# Altium schematic symbol library jlcpcb_2025_04_resistors_extended_1210.schlib: 2670 symbols (part 11 of 14) (continued)
## RC1210JR-07300RL (continued)
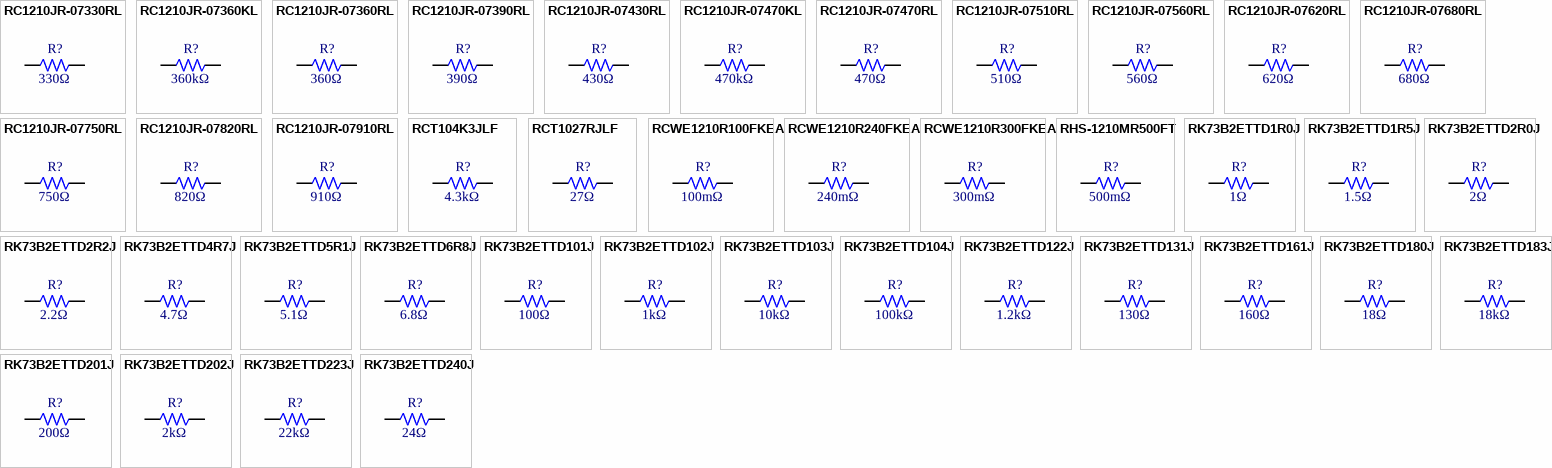
[diagram p51: symbols RC1210JR-07330RL to RK73B2ETTD240J]

## RC1210JR-07330RL
designator R?  Resistance: 330Ω  (hidden comment: *)
Resistor, 330Ω, ±5%, 500mW, 200V, ±100ppm/℃, -55℃~+155℃, SMD 1210; Manufacturer: Uniroyal; Manufacturer Part Number: RC1210JR-07330RL; Supplier 1: LCSC; Supplier Part Number 1: C724013; JLCPCB Part Number: C724013; Power Rating: 500mW; Category: Resistors; Package Size: 1210; JLCPCB Basic Part: Yes; Tolerance: ±5%; Voltage Rating: 200V; Temperature Coefficient: ±100ppm/℃; Temperature Rating: -55℃~+155℃; ComponentLink1Description: Datasheet; ComponentLink1URL: https://wmsc.lcsc.com/wmsc/upload/file/pdf/v2/lcsc/2204291430_YAGEO-RC1210JR-07330RL_C724013.pdf; ComponentLink2Description: JLCPCB Part URL; ComponentLink2URL: https://jlcpcb.com/partdetail/C724013
pins: 1, 2
1 alternate drawing of the same symbol

## RC1210JR-07360KL
designator R?  Resistance: 360kΩ  (hidden comment: *)
Resistor, 360kΩ, ±5%, 500mW, ±100ppm/℃, -55℃~+155℃, SMD 1210; Manufacturer: Uniroyal; Manufacturer Part Number: RC1210JR-07360KL; Supplier 1: LCSC; Supplier Part Number 1: C728402; JLCPCB Part Number: C728402; Power Rating: 500mW; Category: Resistors; Package Size: 1210; JLCPCB Basic Part: Yes; Tolerance: ±5%; Temperature Coefficient: ±100ppm/℃; Temperature Rating: -55℃~+155℃; ComponentLink1Description: Datasheet; ComponentLink1URL: https://wmsc.lcsc.com/wmsc/upload/file/pdf/v2/lcsc/2304140030_YAGEO-RC1210JR-07360KL_C728402.pdf; ComponentLink2Description: JLCPCB Part URL; ComponentLink2URL: https://jlcpcb.com/partdetail/C728402
pins: 1, 2
1 alternate drawing of the same symbol

## RC1210JR-07360RL
designator R?  Resistance: 360Ω  (hidden comment: *)
Resistor, 360Ω, ±5%, 500mW, 200V, ±100ppm/℃, -55℃~+155℃, SMD 1210; Manufacturer: Uniroyal; Manufacturer Part Number: RC1210JR-07360RL; Supplier 1: LCSC; Supplier Part Number 1: C728403; JLCPCB Part Number: C728403; Power Rating: 500mW; Category: Resistors; Package Size: 1210; JLCPCB Basic Part: Yes; Tolerance: ±5%; Voltage Rating: 200V; Temperature Coefficient: ±100ppm/℃; Temperature Rating: -55℃~+155℃; ComponentLink1Description: Datasheet; ComponentLink1URL: https://wmsc.lcsc.com/wmsc/upload/file/pdf/v2/lcsc/2304140030_YAGEO-RC1210JR-07360RL_C728403.pdf; ComponentLink2Description: JLCPCB Part URL; ComponentLink2URL: https://jlcpcb.com/partdetail/C728403
pins: 1, 2
1 alternate drawing of the same symbol

## RC1210JR-07390RL
designator R?  Resistance: 390Ω  (hidden comment: *)
Resistor, 390Ω, ±5%, 500mW, 200V, ±100ppm/℃, -55℃~+155℃, SMD 1210; Manufacturer: Uniroyal; Manufacturer Part Number: RC1210JR-07390RL; Supplier 1: LCSC; Supplier Part Number 1: C326895; JLCPCB Part Number: C326895; Power Rating: 500mW; Category: Resistors; Package Size: 1210; JLCPCB Basic Part: Yes; Tolerance: ±5%; Voltage Rating: 200V; Temperature Coefficient: ±100ppm/℃; Temperature Rating: -55℃~+155℃; ComponentLink1Description: Datasheet; ComponentLink1URL: https://wmsc.lcsc.com/wmsc/upload/file/pdf/v2/lcsc/1811141450_YAGEO-RC1210JR-07390RL_C326895.pdf; ComponentLink2Description: JLCPCB Part URL; ComponentLink2URL: https://jlcpcb.com/partdetail/C326895
pins: 1, 2
1 alternate drawing of the same symbol

## RC1210JR-07430RL
designator R?  Resistance: 430Ω  (hidden comment: *)
Resistor, 430Ω, ±5%, 500mW, ±100ppm/℃, -55℃~+155℃, SMD 1210; Manufacturer: Uniroyal; Manufacturer Part Number: RC1210JR-07430RL; Supplier 1: LCSC; Supplier Part Number 1: C728408; JLCPCB Part Number: C728408; Power Rating: 500mW; Category: Resistors; Package Size: 1210; JLCPCB Basic Part: Yes; Tolerance: ±5%; Temperature Coefficient: ±100ppm/℃; Temperature Rating: -55℃~+155℃; ComponentLink1Description: Datasheet; ComponentLink1URL: https://wmsc.lcsc.com/wmsc/upload/file/pdf/v2/lcsc/2304140030_YAGEO-RC1210JR-07430RL_C728408.pdf; ComponentLink2Description: JLCPCB Part URL; ComponentLink2URL: https://jlcpcb.com/partdetail/C728408
pins: 1, 2
1 alternate drawing of the same symbol

## RC1210JR-07470KL
designator R?  Resistance: 470kΩ  (hidden comment: *)
Resistor, 470kΩ, ±5%, 500mW, 200V, ±100ppm/℃, -55℃~+155℃, SMD 1210; Manufacturer: Uniroyal; Manufacturer Part Number: RC1210JR-07470KL; Supplier 1: LCSC; Supplier Part Number 1: C276324; JLCPCB Part Number: C276324; Power Rating: 500mW; Category: Resistors; Package Size: 1210; JLCPCB Basic Part: Yes; Tolerance: ±5%; Voltage Rating: 200V; Temperature Coefficient: ±100ppm/℃; Temperature Rating: -55℃~+155℃; ComponentLink1Description: Datasheet; ComponentLink1URL: https://wmsc.lcsc.com/wmsc/upload/file/pdf/v2/lcsc/2304140030_YAGEO-RC1210JR-07470KL_C276324.pdf; ComponentLink2Description: JLCPCB Part URL; ComponentLink2URL: https://jlcpcb.com/partdetail/C276324
pins: 1, 2
1 alternate drawing of the same symbol

## RC1210JR-07470RL
designator R?  Resistance: 470Ω  (hidden comment: *)
Resistor, 470Ω, ±5%, 500mW, 200V, ±100ppm/℃, -55℃~+155℃, SMD 1210; Manufacturer: Uniroyal; Manufacturer Part Number: RC1210JR-07470RL; Supplier 1: LCSC; Supplier Part Number 1: C137072; JLCPCB Part Number: C137072; Power Rating: 500mW; Category: Resistors; Package Size: 1210; JLCPCB Basic Part: Yes; Tolerance: ±5%; Voltage Rating: 200V; Temperature Coefficient: ±100ppm/℃; Temperature Rating: -55℃~+155℃; ComponentLink1Description: Datasheet; ComponentLink1URL: https://wmsc.lcsc.com/wmsc/upload/file/pdf/v2/lcsc/2304140030_YAGEO-RC1210JR-07470RL_C137072.pdf; ComponentLink2Description: JLCPCB Part URL; ComponentLink2URL: https://jlcpcb.com/partdetail/C137072
pins: 1, 2
1 alternate drawing of the same symbol

## RC1210JR-07510RL
designator R?  Resistance: 510Ω  (hidden comment: *)
Resistor, 510Ω, ±5%, 500mW, 200V, ±100ppm/℃, -55℃~+155℃, SMD 1210; Manufacturer: Uniroyal; Manufacturer Part Number: RC1210JR-07510RL; Supplier 1: LCSC; Supplier Part Number 1: C276328; JLCPCB Part Number: C276328; Power Rating: 500mW; Category: Resistors; Package Size: 1210; JLCPCB Basic Part: Yes; Tolerance: ±5%; Voltage Rating: 200V; Temperature Coefficient: ±100ppm/℃; Temperature Rating: -55℃~+155℃; ComponentLink1Description: Datasheet; ComponentLink1URL: https://wmsc.lcsc.com/wmsc/upload/file/pdf/v2/lcsc/2304140030_YAGEO-RC1210JR-07510RL_C276328.pdf; ComponentLink2Description: JLCPCB Part URL; ComponentLink2URL: https://jlcpcb.com/partdetail/C276328
pins: 1, 2
1 alternate drawing of the same symbol

## RC1210JR-07560RL
designator R?  Resistance: 560Ω  (hidden comment: *)
Resistor, 560Ω, ±5%, 500mW, ±100ppm/℃, -55℃~+155℃, SMD 1210; Manufacturer: Uniroyal; Manufacturer Part Number: RC1210JR-07560RL; Supplier 1: LCSC; Supplier Part Number 1: C728410; JLCPCB Part Number: C728410; Power Rating: 500mW; Category: Resistors; Package Size: 1210; JLCPCB Basic Part: Yes; Tolerance: ±5%; Temperature Coefficient: ±100ppm/℃; Temperature Rating: -55℃~+155℃; ComponentLink1Description: Datasheet; ComponentLink1URL: https://wmsc.lcsc.com/wmsc/upload/file/pdf/v2/lcsc/2304140030_YAGEO-RC1210JR-07560RL_C728410.pdf; ComponentLink2Description: JLCPCB Part URL; ComponentLink2URL: https://jlcpcb.com/partdetail/C728410
pins: 1, 2
1 alternate drawing of the same symbol

## RC1210JR-07620RL
designator R?  Resistance: 620Ω  (hidden comment: *)
Resistor, 620Ω, ±5%, 500mW, 200V, ±100ppm/℃, -55℃~+155℃, SMD 1210; Manufacturer: Uniroyal; Manufacturer Part Number: RC1210JR-07620RL; Supplier 1: LCSC; Supplier Part Number 1: C723675; JLCPCB Part Number: C723675; Power Rating: 500mW; Category: Resistors; Package Size: 1210; JLCPCB Basic Part: Yes; Tolerance: ±5%; Voltage Rating: 200V; Temperature Coefficient: ±100ppm/℃; Temperature Rating: -55℃~+155℃; ComponentLink1Description: Datasheet; ComponentLink1URL: https://wmsc.lcsc.com/wmsc/upload/file/pdf/v2/lcsc/2008171336_YAGEO-RC1210JR-07620RL_C723675.pdf; ComponentLink2Description: JLCPCB Part URL; ComponentLink2URL: https://jlcpcb.com/partdetail/C723675
pins: 1, 2
1 alternate drawing of the same symbol

## RC1210JR-07680RL
designator R?  Resistance: 680Ω  (hidden comment: *)
Resistor, 680Ω, ±5%, 500mW, 200V, ±100ppm/℃, -55℃~+155℃, SMD 1210; Manufacturer: Uniroyal; Manufacturer Part Number: RC1210JR-07680RL; Supplier 1: LCSC; Supplier Part Number 1: C137071; JLCPCB Part Number: C137071; Power Rating: 500mW; Category: Resistors; Package Size: 1210; JLCPCB Basic Part: Yes; Tolerance: ±5%; Voltage Rating: 200V; Temperature Coefficient: ±100ppm/℃; Temperature Rating: -55℃~+155℃; ComponentLink1Description: Datasheet; ComponentLink1URL: https://wmsc.lcsc.com/wmsc/upload/file/pdf/v2/lcsc/2304140030_YAGEO-RC1210JR-07680RL_C137071.pdf; ComponentLink2Description: JLCPCB Part URL; ComponentLink2URL: https://jlcpcb.com/partdetail/C137071
pins: 1, 2
1 alternate drawing of the same symbol

## RC1210JR-07750RL
designator R?  Resistance: 750Ω  (hidden comment: *)
Resistor, 750Ω, ±5%, 500mW, 200V, ±100ppm/℃, -55℃~+155℃, SMD 1210; Manufacturer: Uniroyal; Manufacturer Part Number: RC1210JR-07750RL; Supplier 1: LCSC; Supplier Part Number 1: C137070; JLCPCB Part Number: C137070; Power Rating: 500mW; Category: Resistors; Package Size: 1210; JLCPCB Basic Part: Yes; Tolerance: ±5%; Voltage Rating: 200V; Temperature Coefficient: ±100ppm/℃; Temperature Rating: -55℃~+155℃; ComponentLink1Description: Datasheet; ComponentLink1URL: https://wmsc.lcsc.com/wmsc/upload/file/pdf/v2/lcsc/2304140030_YAGEO-RC1210JR-07750RL_C137070.pdf; ComponentLink2Description: JLCPCB Part URL; ComponentLink2URL: https://jlcpcb.com/partdetail/C137070
pins: 1, 2
1 alternate drawing of the same symbol

## RC1210JR-07820RL
designator R?  Resistance: 820Ω  (hidden comment: *)
Resistor, 820Ω, ±5%, 500mW, 200V, ±100ppm/℃, -55℃~+155℃, SMD 1210; Manufacturer: Uniroyal; Manufacturer Part Number: RC1210JR-07820RL; Supplier 1: LCSC; Supplier Part Number 1: C137068; JLCPCB Part Number: C137068; Power Rating: 500mW; Category: Resistors; Package Size: 1210; JLCPCB Basic Part: Yes; Tolerance: ±5%; Voltage Rating: 200V; Temperature Coefficient: ±100ppm/℃; Temperature Rating: -55℃~+155℃; ComponentLink1Description: Datasheet; ComponentLink1URL: https://wmsc.lcsc.com/wmsc/upload/file/pdf/v2/lcsc/2304140030_YAGEO-RC1210JR-07820RL_C137068.pdf; ComponentLink2Description: JLCPCB Part URL; ComponentLink2URL: https://jlcpcb.com/partdetail/C137068
pins: 1, 2
1 alternate drawing of the same symbol

## RC1210JR-07910RL
designator R?  Resistance: 910Ω  (hidden comment: *)
Resistor, 910Ω, ±5%, 500mW, ±100ppm/℃, -55℃~+155℃, SMD 1210; Manufacturer: Uniroyal; Manufacturer Part Number: RC1210JR-07910RL; Supplier 1: LCSC; Supplier Part Number 1: C723577; JLCPCB Part Number: C723577; Power Rating: 500mW; Category: Resistors; Package Size: 1210; JLCPCB Basic Part: Yes; Tolerance: ±5%; Temperature Coefficient: ±100ppm/℃; Temperature Rating: -55℃~+155℃; ComponentLink1Description: Datasheet; ComponentLink1URL: https://wmsc.lcsc.com/wmsc/upload/file/pdf/v2/lcsc/2008171334_YAGEO-RC1210JR-07910RL_C723577.pdf; ComponentLink2Description: JLCPCB Part URL; ComponentLink2URL: https://jlcpcb.com/partdetail/C723577
pins: 1, 2
1 alternate drawing of the same symbol

## RCT104K3JLF
designator R?  Resistance: 4.3kΩ  (hidden comment: *)
Resistor, 4.3kΩ, ±5%, 333.333mW, SMD 1210; Manufacturer: Uniroyal; Manufacturer Part Number: RCT104K3JLF; Supplier 1: LCSC; Supplier Part Number 1: C185761; JLCPCB Part Number: C185761; Power Rating: 333.333mW; Category: Resistors; Package Size: 1210; JLCPCB Basic Part: Yes; Tolerance: ±5%; ComponentLink1Description: Datasheet; ComponentLink1URL: https://datasheet.lcsc.com/lcsc/2304140030_HKR-Hong-Kong-Resistors-RCT104K3JLF_C185761.pdf; ComponentLink2Description: JLCPCB Part URL; ComponentLink2URL: https://jlcpcb.com/partdetail/C185761
pins: 1, 2
1 alternate drawing of the same symbol

## RCT1027RJLF
designator R?  Resistance: 27Ω  (hidden comment: *)
Resistor, 27Ω, ±5%, 333.333mW, SMD 1210; Manufacturer: Uniroyal; Manufacturer Part Number: RCT1027RJLF; Supplier 1: LCSC; Supplier Part Number 1: C185752; JLCPCB Part Number: C185752; Power Rating: 333.333mW; Category: Resistors; Package Size: 1210; JLCPCB Basic Part: Yes; Tolerance: ±5%; ComponentLink1Description: Datasheet; ComponentLink1URL: https://datasheet.lcsc.com/lcsc/2304140030_HKR-Hong-Kong-Resistors-RCT1027RJLF_C185752.pdf; ComponentLink2Description: JLCPCB Part URL; ComponentLink2URL: https://jlcpcb.com/partdetail/C185752
pins: 1, 2
1 alternate drawing of the same symbol

## RCWE1210R100FKEA
designator R?  Resistance: 100mΩ  (hidden comment: *)
Resistor, 100mΩ, ±1%, 1W, 300V, ±100ppm/℃, -55℃~+155℃, SMD 1210; Manufacturer: Uniroyal; Manufacturer Part Number: RCWE1210R100FKEA; Supplier 1: LCSC; Supplier Part Number 1: C2094571; JLCPCB Part Number: C2094571; Power Rating: 1W; Category: Resistors; Package Size: 1210; JLCPCB Basic Part: Yes; Tolerance: ±1%; Voltage Rating: 300V; Temperature Coefficient: ±100ppm/℃; Temperature Rating: -55℃~+155℃; ComponentLink1Description: Datasheet; ComponentLink1URL: https://wmsc.lcsc.com/wmsc/upload/file/pdf/v2/lcsc/2304140030_Vishay-Intertech-RCWE1210R100FKEA_C2094571.pdf; ComponentLink2Description: JLCPCB Part URL; ComponentLink2URL: https://jlcpcb.com/partdetail/C2094571
pins: 1, 2
1 alternate drawing of the same symbol

## RCWE1210R240FKEA
designator R?  Resistance: 240mΩ  (hidden comment: *)
Resistor, 240mΩ, ±1%, 1W, 300V, ±100ppm/℃, -55℃~+155℃, SMD 1210; Manufacturer: Uniroyal; Manufacturer Part Number: RCWE1210R240FKEA; Supplier 1: LCSC; Supplier Part Number 1: C2088954; JLCPCB Part Number: C2088954; Power Rating: 1W; Category: Resistors; Package Size: 1210; JLCPCB Basic Part: Yes; Tolerance: ±1%; Voltage Rating: 300V; Temperature Coefficient: ±100ppm/℃; Temperature Rating: -55℃~+155℃; ComponentLink1Description: Datasheet; ComponentLink1URL: https://wmsc.lcsc.com/wmsc/upload/file/pdf/v2/lcsc/2304140030_Vishay-Intertech-RCWE1210R240FKEA_C2088954.pdf; ComponentLink2Description: JLCPCB Part URL; ComponentLink2URL: https://jlcpcb.com/partdetail/C2088954
pins: 1, 2
1 alternate drawing of the same symbol

## RCWE1210R300FKEA
designator R?  Resistance: 300mΩ  (hidden comment: *)
Resistor, 300mΩ, ±1%, 1W, ±100ppm/℃, -55℃~+155℃, SMD 1210; Manufacturer: Uniroyal; Manufacturer Part Number: RCWE1210R300FKEA; Supplier 1: LCSC; Supplier Part Number 1: C4014599; JLCPCB Part Number: C4014599; Power Rating: 1W; Category: Resistors; Package Size: 1210; JLCPCB Basic Part: Yes; Tolerance: ±1%; Temperature Coefficient: ±100ppm/℃; Temperature Rating: -55℃~+155℃; ComponentLink1Description: Datasheet; ComponentLink1URL: https://wmsc.lcsc.com/wmsc/upload/file/pdf/v2/lcsc/2312130920_Vishay-Intertech-RCWE1210R300FKEA_C4014599.pdf; ComponentLink2Description: JLCPCB Part URL; ComponentLink2URL: https://jlcpcb.com/partdetail/C4014599
pins: 1, 2
1 alternate drawing of the same symbol

## RHS-1210MR500FT
designator R?  Resistance: 500mΩ  (hidden comment: *)
Resistor, 500mΩ, ±1%, SMD 1210; Manufacturer: Uniroyal; Manufacturer Part Number: RHS-1210MR500FT; Supplier 1: LCSC; Supplier Part Number 1: C2991678; JLCPCB Part Number: C2991678; Category: Resistors; Package Size: 1210; JLCPCB Basic Part: Yes; Tolerance: ±1%; ComponentLink1Description: Datasheet; ComponentLink1URL: https://wmsc.lcsc.com/wmsc/upload/file/pdf/v2/lcsc/2211281000_FH--Guangdong-Fenghua-Advanced-Tech-RHS-1210MR500FT_C2991678.pdf; ComponentLink2Description: JLCPCB Part URL; ComponentLink2URL: https://jlcpcb.com/partdetail/C2991678
pins: 1, 2
1 alternate drawing of the same symbol

## RK73B2ETTD1R0J
designator R?  Resistance: 1Ω  (hidden comment: *)
Resistor, 1Ω, ±5%, 500mW, ±200ppm/℃, -55℃~+155℃, SMD 1210; Manufacturer: Uniroyal; Manufacturer Part Number: RK73B2ETTD1R0J; Supplier 1: LCSC; Supplier Part Number 1: C830163; JLCPCB Part Number: C830163; Power Rating: 500mW; Category: Resistors; Package Size: 1210; JLCPCB Basic Part: Yes; Tolerance: ±5%; Temperature Coefficient: ±200ppm/℃; Temperature Rating: -55℃~+155℃; ComponentLink1Description: Datasheet; ComponentLink1URL: https://wmsc.lcsc.com/wmsc/upload/file/pdf/v2/lcsc/2403141437_KOA-Speer-Elec-RK73B2ETTD1R0J_C830163.pdf; ComponentLink2Description: JLCPCB Part URL; ComponentLink2URL: https://jlcpcb.com/partdetail/C830163
pins: 1, 2
1 alternate drawing of the same symbol

## RK73B2ETTD1R5J
designator R?  Resistance: 1.5Ω  (hidden comment: *)
Resistor, 1.5Ω, ±5%, 500mW, ±200ppm/℃, -55℃~+155℃, SMD 1210; Manufacturer: Uniroyal; Manufacturer Part Number: RK73B2ETTD1R5J; Supplier 1: LCSC; Supplier Part Number 1: C830164; JLCPCB Part Number: C830164; Power Rating: 500mW; Category: Resistors; Package Size: 1210; JLCPCB Basic Part: Yes; Tolerance: ±5%; Temperature Coefficient: ±200ppm/℃; Temperature Rating: -55℃~+155℃; ComponentLink1Description: Datasheet; ComponentLink1URL: https://wmsc.lcsc.com/wmsc/upload/file/pdf/v2/lcsc/2403141437_KOA-Speer-Elec-RK73B2ETTD1R5J_C830164.pdf; ComponentLink2Description: JLCPCB Part URL; ComponentLink2URL: https://jlcpcb.com/partdetail/C830164
pins: 1, 2
1 alternate drawing of the same symbol

## RK73B2ETTD2R0J
designator R?  Resistance: 2Ω  (hidden comment: *)
Resistor, 2Ω, ±5%, 500mW, ±200ppm/℃, -55℃~+155℃, SMD 1210; Manufacturer: Uniroyal; Manufacturer Part Number: RK73B2ETTD2R0J; Supplier 1: LCSC; Supplier Part Number 1: C830178; JLCPCB Part Number: C830178; Power Rating: 500mW; Category: Resistors; Package Size: 1210; JLCPCB Basic Part: Yes; Tolerance: ±5%; Temperature Coefficient: ±200ppm/℃; Temperature Rating: -55℃~+155℃; ComponentLink1Description: Datasheet; ComponentLink1URL: https://wmsc.lcsc.com/wmsc/upload/file/pdf/v2/lcsc/2403141437_KOA-Speer-Elec-RK73B2ETTD2R0J_C830178.pdf; ComponentLink2Description: JLCPCB Part URL; ComponentLink2URL: https://jlcpcb.com/partdetail/C830178
pins: 1, 2
1 alternate drawing of the same symbol

## RK73B2ETTD2R2J
designator R?  Resistance: 2.2Ω  (hidden comment: *)
Resistor, 2.2Ω, ±5%, 500mW, ±200ppm/℃, -55℃~+155℃, SMD 1210; Manufacturer: Uniroyal; Manufacturer Part Number: RK73B2ETTD2R2J; Supplier 1: LCSC; Supplier Part Number 1: C830179; JLCPCB Part Number: C830179; Power Rating: 500mW; Category: Resistors; Package Size: 1210; JLCPCB Basic Part: Yes; Tolerance: ±5%; Temperature Coefficient: ±200ppm/℃; Temperature Rating: -55℃~+155℃; ComponentLink1Description: Datasheet; ComponentLink1URL: https://wmsc.lcsc.com/wmsc/upload/file/pdf/v2/lcsc/2403141437_KOA-Speer-Elec-RK73B2ETTD2R2J_C830179.pdf; ComponentLink2Description: JLCPCB Part URL; ComponentLink2URL: https://jlcpcb.com/partdetail/C830179
pins: 1, 2
1 alternate drawing of the same symbol

## RK73B2ETTD4R7J
designator R?  Resistance: 4.7Ω  (hidden comment: *)
Resistor, 4.7Ω, ±5%, 500mW, ±200ppm/℃, -55℃~+155℃, SMD 1210; Manufacturer: Uniroyal; Manufacturer Part Number: RK73B2ETTD4R7J; Supplier 1: LCSC; Supplier Part Number 1: C830189; JLCPCB Part Number: C830189; Power Rating: 500mW; Category: Resistors; Package Size: 1210; JLCPCB Basic Part: Yes; Tolerance: ±5%; Temperature Coefficient: ±200ppm/℃; Temperature Rating: -55℃~+155℃; ComponentLink1Description: Datasheet; ComponentLink1URL: https://wmsc.lcsc.com/wmsc/upload/file/pdf/v2/lcsc/2403141437_KOA-Speer-Elec-RK73B2ETTD4R7J_C830189.pdf; ComponentLink2Description: JLCPCB Part URL; ComponentLink2URL: https://jlcpcb.com/partdetail/C830189
pins: 1, 2
1 alternate drawing of the same symbol

## RK73B2ETTD5R1J
designator R?  Resistance: 5.1Ω  (hidden comment: *)
Resistor, 5.1Ω, ±5%, 500mW, ±200ppm/℃, -55℃~+155℃, SMD 1210; Manufacturer: Uniroyal; Manufacturer Part Number: RK73B2ETTD5R1J; Supplier 1: LCSC; Supplier Part Number 1: C830192; JLCPCB Part Number: C830192; Power Rating: 500mW; Category: Resistors; Package Size: 1210; JLCPCB Basic Part: Yes; Tolerance: ±5%; Temperature Coefficient: ±200ppm/℃; Temperature Rating: -55℃~+155℃; ComponentLink1Description: Datasheet; ComponentLink1URL: https://wmsc.lcsc.com/wmsc/upload/file/pdf/v2/lcsc/2403141437_KOA-Speer-Elec-RK73B2ETTD5R1J_C830192.pdf; ComponentLink2Description: JLCPCB Part URL; ComponentLink2URL: https://jlcpcb.com/partdetail/C830192
pins: 1, 2
1 alternate drawing of the same symbol

## RK73B2ETTD6R8J
designator R?  Resistance: 6.8Ω  (hidden comment: *)
Resistor, 6.8Ω, ±5%, 500mW, ±200ppm/℃, -55℃~+155℃, SMD 1210; Manufacturer: Uniroyal; Manufacturer Part Number: RK73B2ETTD6R8J; Supplier 1: LCSC; Supplier Part Number 1: C830198; JLCPCB Part Number: C830198; Power Rating: 500mW; Category: Resistors; Package Size: 1210; JLCPCB Basic Part: Yes; Tolerance: ±5%; Temperature Coefficient: ±200ppm/℃; Temperature Rating: -55℃~+155℃; ComponentLink1Description: Datasheet; ComponentLink1URL: https://wmsc.lcsc.com/wmsc/upload/file/pdf/v2/lcsc/2403141437_KOA-Speer-Elec-RK73B2ETTD6R8J_C830198.pdf; ComponentLink2Description: JLCPCB Part URL; ComponentLink2URL: https://jlcpcb.com/partdetail/C830198
pins: 1, 2
1 alternate drawing of the same symbol

## RK73B2ETTD101J
designator R?  Resistance: 100Ω  (hidden comment: *)
Resistor, 100Ω, ±5%, 750mW, 200V, ±200ppm/℃, -55℃~+155℃, SMD 1210; Manufacturer: Uniroyal; Manufacturer Part Number: RK73B2ETTD101J; Supplier 1: LCSC; Supplier Part Number 1: C131363; JLCPCB Part Number: C131363; Power Rating: 750mW; Category: Resistors; Package Size: 1210; JLCPCB Basic Part: Yes; Tolerance: ±5%; Voltage Rating: 200V; Temperature Coefficient: ±200ppm/℃; Temperature Rating: -55℃~+155℃; ComponentLink1Description: Datasheet; ComponentLink1URL: https://wmsc.lcsc.com/wmsc/upload/file/pdf/v2/lcsc/2403141437_KOA-Speer-Elec-RK73B2ETTD101J_C131363.pdf; ComponentLink2Description: JLCPCB Part URL; ComponentLink2URL: https://jlcpcb.com/partdetail/C131363
pins: 1, 2
1 alternate drawing of the same symbol

## RK73B2ETTD102J
designator R?  Resistance: 1kΩ  (hidden comment: *)
Resistor, 1kΩ, ±5%, 750mW, 200V, ±200ppm/℃, -55℃~+155℃, SMD 1210; Manufacturer: Uniroyal; Manufacturer Part Number: RK73B2ETTD102J; Supplier 1: LCSC; Supplier Part Number 1: C131364; JLCPCB Part Number: C131364; Power Rating: 750mW; Category: Resistors; Package Size: 1210; JLCPCB Basic Part: Yes; Tolerance: ±5%; Voltage Rating: 200V; Temperature Coefficient: ±200ppm/℃; Temperature Rating: -55℃~+155℃; ComponentLink1Description: Datasheet; ComponentLink1URL: https://wmsc.lcsc.com/wmsc/upload/file/pdf/v2/lcsc/2403141437_KOA-Speer-Elec-RK73B2ETTD102J_C131364.pdf; ComponentLink2Description: JLCPCB Part URL; ComponentLink2URL: https://jlcpcb.com/partdetail/C131364
pins: 1, 2
1 alternate drawing of the same symbol

## RK73B2ETTD103J
designator R?  Resistance: 10kΩ  (hidden comment: *)
Resistor, 10kΩ, ±5%, 750mW, 200V, ±200ppm/℃, -55℃~+155℃, SMD 1210; Manufacturer: Uniroyal; Manufacturer Part Number: RK73B2ETTD103J; Supplier 1: LCSC; Supplier Part Number 1: C131365; JLCPCB Part Number: C131365; Power Rating: 750mW; Category: Resistors; Package Size: 1210; JLCPCB Basic Part: Yes; Tolerance: ±5%; Voltage Rating: 200V; Temperature Coefficient: ±200ppm/℃; Temperature Rating: -55℃~+155℃; ComponentLink1Description: Datasheet; ComponentLink1URL: https://wmsc.lcsc.com/wmsc/upload/file/pdf/v2/lcsc/2403141437_KOA-Speer-Elec-RK73B2ETTD103J_C131365.pdf; ComponentLink2Description: JLCPCB Part URL; ComponentLink2URL: https://jlcpcb.com/partdetail/C131365
pins: 1, 2
1 alternate drawing of the same symbol

## RK73B2ETTD104J
designator R?  Resistance: 100kΩ  (hidden comment: *)
Resistor, 100kΩ, ±5%, 500mW, ±200ppm/℃, -55℃~+155℃, SMD 1210; Manufacturer: Uniroyal; Manufacturer Part Number: RK73B2ETTD104J; Supplier 1: LCSC; Supplier Part Number 1: C830151; JLCPCB Part Number: C830151; Power Rating: 500mW; Category: Resistors; Package Size: 1210; JLCPCB Basic Part: Yes; Tolerance: ±5%; Temperature Coefficient: ±200ppm/℃; Temperature Rating: -55℃~+155℃; ComponentLink1Description: Datasheet; ComponentLink1URL: https://wmsc.lcsc.com/wmsc/upload/file/pdf/v2/lcsc/2403141437_KOA-Speer-Elec-RK73B2ETTD104J_C830151.pdf; ComponentLink2Description: JLCPCB Part URL; ComponentLink2URL: https://jlcpcb.com/partdetail/C830151
pins: 1, 2
1 alternate drawing of the same symbol

## RK73B2ETTD122J
designator R?  Resistance: 1.2kΩ  (hidden comment: *)
Resistor, 1.2kΩ, ±5%, 500mW, ±200ppm/℃, -55℃~+155℃, SMD 1210; Manufacturer: Uniroyal; Manufacturer Part Number: RK73B2ETTD122J; Supplier 1: LCSC; Supplier Part Number 1: C830154; JLCPCB Part Number: C830154; Power Rating: 500mW; Category: Resistors; Package Size: 1210; JLCPCB Basic Part: Yes; Tolerance: ±5%; Temperature Coefficient: ±200ppm/℃; Temperature Rating: -55℃~+155℃; ComponentLink1Description: Datasheet; ComponentLink1URL: https://wmsc.lcsc.com/wmsc/upload/file/pdf/v2/lcsc/2403141437_KOA-Speer-Elec-RK73B2ETTD122J_C830154.pdf; ComponentLink2Description: JLCPCB Part URL; ComponentLink2URL: https://jlcpcb.com/partdetail/C830154
pins: 1, 2
1 alternate drawing of the same symbol

## RK73B2ETTD131J
designator R?  Resistance: 130Ω  (hidden comment: *)
Resistor, 130Ω, ±5%, 500mW, ±200ppm/℃, -55℃~+155℃, SMD 1210; Manufacturer: Uniroyal; Manufacturer Part Number: RK73B2ETTD131J; Supplier 1: LCSC; Supplier Part Number 1: C830155; JLCPCB Part Number: C830155; Power Rating: 500mW; Category: Resistors; Package Size: 1210; JLCPCB Basic Part: Yes; Tolerance: ±5%; Temperature Coefficient: ±200ppm/℃; Temperature Rating: -55℃~+155℃; ComponentLink1Description: Datasheet; ComponentLink1URL: https://wmsc.lcsc.com/wmsc/upload/file/pdf/v2/lcsc/2403141437_KOA-Speer-Elec-RK73B2ETTD131J_C830155.pdf; ComponentLink2Description: JLCPCB Part URL; ComponentLink2URL: https://jlcpcb.com/partdetail/C830155
pins: 1, 2
1 alternate drawing of the same symbol

## RK73B2ETTD161J
designator R?  Resistance: 160Ω  (hidden comment: *)
Resistor, 160Ω, ±5%, 500mW, ±200ppm/℃, -55℃~+155℃, SMD 1210; Manufacturer: Uniroyal; Manufacturer Part Number: RK73B2ETTD161J; Supplier 1: LCSC; Supplier Part Number 1: C830158; JLCPCB Part Number: C830158; Power Rating: 500mW; Category: Resistors; Package Size: 1210; JLCPCB Basic Part: Yes; Tolerance: ±5%; Temperature Coefficient: ±200ppm/℃; Temperature Rating: -55℃~+155℃; ComponentLink1Description: Datasheet; ComponentLink1URL: https://wmsc.lcsc.com/wmsc/upload/file/pdf/v2/lcsc/2403141437_KOA-Speer-Elec-RK73B2ETTD161J_C830158.pdf; ComponentLink2Description: JLCPCB Part URL; ComponentLink2URL: https://jlcpcb.com/partdetail/C830158
pins: 1, 2
1 alternate drawing of the same symbol

## RK73B2ETTD180J
designator R?  Resistance: 18Ω  (hidden comment: *)
Resistor, 18Ω, ±5%, 500mW, ±200ppm/℃, -55℃~+155℃, SMD 1210; Manufacturer: Uniroyal; Manufacturer Part Number: RK73B2ETTD180J; Supplier 1: LCSC; Supplier Part Number 1: C830159; JLCPCB Part Number: C830159; Power Rating: 500mW; Category: Resistors; Package Size: 1210; JLCPCB Basic Part: Yes; Tolerance: ±5%; Temperature Coefficient: ±200ppm/℃; Temperature Rating: -55℃~+155℃; ComponentLink1Description: Datasheet; ComponentLink1URL: https://wmsc.lcsc.com/wmsc/upload/file/pdf/v2/lcsc/2403141437_KOA-Speer-Elec-RK73B2ETTD180J_C830159.pdf; ComponentLink2Description: JLCPCB Part URL; ComponentLink2URL: https://jlcpcb.com/partdetail/C830159
pins: 1, 2
1 alternate drawing of the same symbol

## RK73B2ETTD183J
designator R?  Resistance: 18kΩ  (hidden comment: *)
Resistor, 18kΩ, ±5%, 500mW, ±200ppm/℃, -55℃~+155℃, SMD 1210; Manufacturer: Uniroyal; Manufacturer Part Number: RK73B2ETTD183J; Supplier 1: LCSC; Supplier Part Number 1: C830162; JLCPCB Part Number: C830162; Power Rating: 500mW; Category: Resistors; Package Size: 1210; JLCPCB Basic Part: Yes; Tolerance: ±5%; Temperature Coefficient: ±200ppm/℃; Temperature Rating: -55℃~+155℃; ComponentLink1Description: Datasheet; ComponentLink1URL: https://wmsc.lcsc.com/wmsc/upload/file/pdf/v2/lcsc/2403141437_KOA-Speer-Elec-RK73B2ETTD183J_C830162.pdf; ComponentLink2Description: JLCPCB Part URL; ComponentLink2URL: https://jlcpcb.com/partdetail/C830162
pins: 1, 2
1 alternate drawing of the same symbol

## RK73B2ETTD201J
designator R?  Resistance: 200Ω  (hidden comment: *)
Resistor, 200Ω, ±5%, 500mW, ±200ppm/℃, -55℃~+155℃, SMD 1210; Manufacturer: Uniroyal; Manufacturer Part Number: RK73B2ETTD201J; Supplier 1: LCSC; Supplier Part Number 1: C830166; JLCPCB Part Number: C830166; Power Rating: 500mW; Category: Resistors; Package Size: 1210; JLCPCB Basic Part: Yes; Tolerance: ±5%; Temperature Coefficient: ±200ppm/℃; Temperature Rating: -55℃~+155℃; ComponentLink1Description: Datasheet; ComponentLink1URL: https://wmsc.lcsc.com/wmsc/upload/file/pdf/v2/lcsc/2403141437_KOA-Speer-Elec-RK73B2ETTD201J_C830166.pdf; ComponentLink2Description: JLCPCB Part URL; ComponentLink2URL: https://jlcpcb.com/partdetail/C830166
pins: 1, 2
1 alternate drawing of the same symbol

## RK73B2ETTD202J
designator R?  Resistance: 2kΩ  (hidden comment: *)
Resistor, 2kΩ, ±5%, 500mW, ±200ppm/℃, -55℃~+155℃, SMD 1210; Manufacturer: Uniroyal; Manufacturer Part Number: RK73B2ETTD202J; Supplier 1: LCSC; Supplier Part Number 1: C830167; JLCPCB Part Number: C830167; Power Rating: 500mW; Category: Resistors; Package Size: 1210; JLCPCB Basic Part: Yes; Tolerance: ±5%; Temperature Coefficient: ±200ppm/℃; Temperature Rating: -55℃~+155℃; ComponentLink1Description: Datasheet; ComponentLink1URL: https://wmsc.lcsc.com/wmsc/upload/file/pdf/v2/lcsc/2403141437_KOA-Speer-Elec-RK73B2ETTD202J_C830167.pdf; ComponentLink2Description: JLCPCB Part URL; ComponentLink2URL: https://jlcpcb.com/partdetail/C830167
pins: 1, 2
1 alternate drawing of the same symbol

## RK73B2ETTD223J
designator R?  Resistance: 22kΩ  (hidden comment: *)
Resistor, 22kΩ, ±5%, 500mW, ±200ppm/℃, -55℃~+155℃, SMD 1210; Manufacturer: Uniroyal; Manufacturer Part Number: RK73B2ETTD223J; Supplier 1: LCSC; Supplier Part Number 1: C830171; JLCPCB Part Number: C830171; Power Rating: 500mW; Category: Resistors; Package Size: 1210; JLCPCB Basic Part: Yes; Tolerance: ±5%; Temperature Coefficient: ±200ppm/℃; Temperature Rating: -55℃~+155℃; ComponentLink1Description: Datasheet; ComponentLink1URL: https://wmsc.lcsc.com/wmsc/upload/file/pdf/v2/lcsc/2403141437_KOA-Speer-Elec-RK73B2ETTD223J_C830171.pdf; ComponentLink2Description: JLCPCB Part URL; ComponentLink2URL: https://jlcpcb.com/partdetail/C830171
pins: 1, 2
1 alternate drawing of the same symbol

## RK73B2ETTD240J
designator R?  Resistance: 24Ω  (hidden comment: *)
Resistor, 24Ω, ±5%, 500mW, ±200ppm/℃, -55℃~+155℃, SMD 1210; Manufacturer: Uniroyal; Manufacturer Part Number: RK73B2ETTD240J; Supplier 1: LCSC; Supplier Part Number 1: C830172; JLCPCB Part Number: C830172; Power Rating: 500mW; Category: Resistors; Package Size: 1210; JLCPCB Basic Part: Yes; Tolerance: ±5%; Temperature Coefficient: ±200ppm/℃; Temperature Rating: -55℃~+155℃; ComponentLink1Description: Datasheet; ComponentLink1URL: https://wmsc.lcsc.com/wmsc/upload/file/pdf/v2/lcsc/2403141437_KOA-Speer-Elec-RK73B2ETTD240J_C830172.pdf; ComponentLink2Description: JLCPCB Part URL; ComponentLink2URL: https://jlcpcb.com/partdetail/C830172
pins: 1, 2
1 alternate drawing of the same symbol

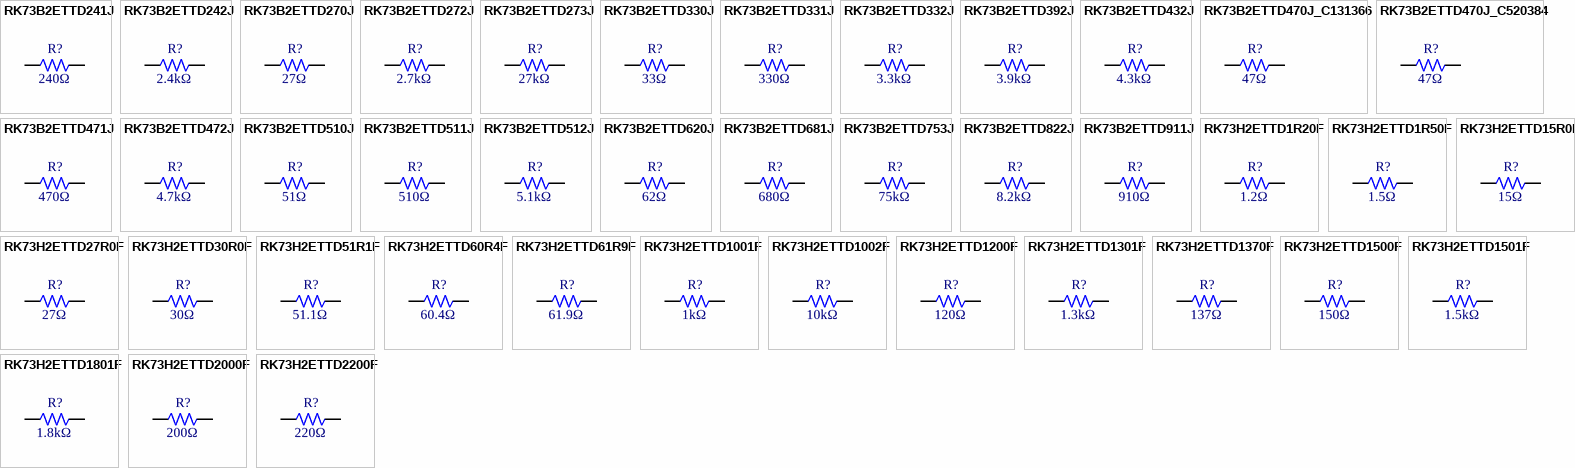
[diagram p52: symbols RK73B2ETTD241J to RK73H2ETTD2200F]

## RK73B2ETTD241J
designator R?  Resistance: 240Ω  (hidden comment: *)
Resistor, 240Ω, ±5%, 500mW, ±200ppm/℃, -55℃~+155℃, SMD 1210; Manufacturer: Uniroyal; Manufacturer Part Number: RK73B2ETTD241J; Supplier 1: LCSC; Supplier Part Number 1: C830173; JLCPCB Part Number: C830173; Power Rating: 500mW; Category: Resistors; Package Size: 1210; JLCPCB Basic Part: Yes; Tolerance: ±5%; Temperature Coefficient: ±200ppm/℃; Temperature Rating: -55℃~+155℃; ComponentLink1Description: Datasheet; ComponentLink1URL: https://wmsc.lcsc.com/wmsc/upload/file/pdf/v2/lcsc/2403141437_KOA-Speer-Elec-RK73B2ETTD241J_C830173.pdf; ComponentLink2Description: JLCPCB Part URL; ComponentLink2URL: https://jlcpcb.com/partdetail/C830173
pins: 1, 2
1 alternate drawing of the same symbol

## RK73B2ETTD242J
designator R?  Resistance: 2.4kΩ  (hidden comment: *)
Resistor, 2.4kΩ, ±5%, 500mW, ±200ppm/℃, -55℃~+155℃, SMD 1210; Manufacturer: Uniroyal; Manufacturer Part Number: RK73B2ETTD242J; Supplier 1: LCSC; Supplier Part Number 1: C830174; JLCPCB Part Number: C830174; Power Rating: 500mW; Category: Resistors; Package Size: 1210; JLCPCB Basic Part: Yes; Tolerance: ±5%; Temperature Coefficient: ±200ppm/℃; Temperature Rating: -55℃~+155℃; ComponentLink1Description: Datasheet; ComponentLink1URL: https://wmsc.lcsc.com/wmsc/upload/file/pdf/v2/lcsc/2403141437_KOA-Speer-Elec-RK73B2ETTD242J_C830174.pdf; ComponentLink2Description: JLCPCB Part URL; ComponentLink2URL: https://jlcpcb.com/partdetail/C830174
pins: 1, 2
1 alternate drawing of the same symbol

## RK73B2ETTD270J
designator R?  Resistance: 27Ω  (hidden comment: *)
Resistor, 27Ω, ±5%, 500mW, ±200ppm/℃, -55℃~+155℃, SMD 1210; Manufacturer: Uniroyal; Manufacturer Part Number: RK73B2ETTD270J; Supplier 1: LCSC; Supplier Part Number 1: C830175; JLCPCB Part Number: C830175; Power Rating: 500mW; Category: Resistors; Package Size: 1210; JLCPCB Basic Part: Yes; Tolerance: ±5%; Temperature Coefficient: ±200ppm/℃; Temperature Rating: -55℃~+155℃; ComponentLink1Description: Datasheet; ComponentLink1URL: https://wmsc.lcsc.com/wmsc/upload/file/pdf/v2/lcsc/2403141437_KOA-Speer-Elec-RK73B2ETTD270J_C830175.pdf; ComponentLink2Description: JLCPCB Part URL; ComponentLink2URL: https://jlcpcb.com/partdetail/C830175
pins: 1, 2
1 alternate drawing of the same symbol

## RK73B2ETTD272J
designator R?  Resistance: 2.7kΩ  (hidden comment: *)
Resistor, 2.7kΩ, ±5%, 500mW, ±200ppm/℃, -55℃~+155℃, SMD 1210; Manufacturer: Uniroyal; Manufacturer Part Number: RK73B2ETTD272J; Supplier 1: LCSC; Supplier Part Number 1: C830176; JLCPCB Part Number: C830176; Power Rating: 500mW; Category: Resistors; Package Size: 1210; JLCPCB Basic Part: Yes; Tolerance: ±5%; Temperature Coefficient: ±200ppm/℃; Temperature Rating: -55℃~+155℃; ComponentLink1Description: Datasheet; ComponentLink1URL: https://wmsc.lcsc.com/wmsc/upload/file/pdf/v2/lcsc/2403141437_KOA-Speer-Elec-RK73B2ETTD272J_C830176.pdf; ComponentLink2Description: JLCPCB Part URL; ComponentLink2URL: https://jlcpcb.com/partdetail/C830176
pins: 1, 2
1 alternate drawing of the same symbol

## RK73B2ETTD273J
designator R?  Resistance: 27kΩ  (hidden comment: *)
Resistor, 27kΩ, ±5%, 500mW, ±200ppm/℃, -55℃~+155℃, SMD 1210; Manufacturer: Uniroyal; Manufacturer Part Number: RK73B2ETTD273J; Supplier 1: LCSC; Supplier Part Number 1: C830177; JLCPCB Part Number: C830177; Power Rating: 500mW; Category: Resistors; Package Size: 1210; JLCPCB Basic Part: Yes; Tolerance: ±5%; Temperature Coefficient: ±200ppm/℃; Temperature Rating: -55℃~+155℃; ComponentLink1Description: Datasheet; ComponentLink1URL: https://wmsc.lcsc.com/wmsc/upload/file/pdf/v2/lcsc/2403141437_KOA-Speer-Elec-RK73B2ETTD273J_C830177.pdf; ComponentLink2Description: JLCPCB Part URL; ComponentLink2URL: https://jlcpcb.com/partdetail/C830177
pins: 1, 2
1 alternate drawing of the same symbol

## RK73B2ETTD330J
designator R?  Resistance: 33Ω  (hidden comment: *)
Resistor, 33Ω, ±5%, 500mW, ±200ppm/℃, -55℃~+155℃, SMD 1210; Manufacturer: Uniroyal; Manufacturer Part Number: RK73B2ETTD330J; Supplier 1: LCSC; Supplier Part Number 1: C830181; JLCPCB Part Number: C830181; Power Rating: 500mW; Category: Resistors; Package Size: 1210; JLCPCB Basic Part: Yes; Tolerance: ±5%; Temperature Coefficient: ±200ppm/℃; Temperature Rating: -55℃~+155℃; ComponentLink1Description: Datasheet; ComponentLink1URL: https://wmsc.lcsc.com/wmsc/upload/file/pdf/v2/lcsc/2403141437_KOA-Speer-Elec-RK73B2ETTD330J_C830181.pdf; ComponentLink2Description: JLCPCB Part URL; ComponentLink2URL: https://jlcpcb.com/partdetail/C830181
pins: 1, 2
1 alternate drawing of the same symbol

## RK73B2ETTD331J
designator R?  Resistance: 330Ω  (hidden comment: *)
Resistor, 330Ω, ±5%, 500mW, ±200ppm/℃, -55℃~+155℃, SMD 1210; Manufacturer: Uniroyal; Manufacturer Part Number: RK73B2ETTD331J; Supplier 1: LCSC; Supplier Part Number 1: C830182; JLCPCB Part Number: C830182; Power Rating: 500mW; Category: Resistors; Package Size: 1210; JLCPCB Basic Part: Yes; Tolerance: ±5%; Temperature Coefficient: ±200ppm/℃; Temperature Rating: -55℃~+155℃; ComponentLink1Description: Datasheet; ComponentLink1URL: https://wmsc.lcsc.com/wmsc/upload/file/pdf/v2/lcsc/2403141437_KOA-Speer-Elec-RK73B2ETTD331J_C830182.pdf; ComponentLink2Description: JLCPCB Part URL; ComponentLink2URL: https://jlcpcb.com/partdetail/C830182
pins: 1, 2
1 alternate drawing of the same symbol

## RK73B2ETTD332J
designator R?  Resistance: 3.3kΩ  (hidden comment: *)
Resistor, 3.3kΩ, ±5%, 500mW, ±200ppm/℃, -55℃~+155℃, SMD 1210; Manufacturer: Uniroyal; Manufacturer Part Number: RK73B2ETTD332J; Supplier 1: LCSC; Supplier Part Number 1: C830183; JLCPCB Part Number: C830183; Power Rating: 500mW; Category: Resistors; Package Size: 1210; JLCPCB Basic Part: Yes; Tolerance: ±5%; Temperature Coefficient: ±200ppm/℃; Temperature Rating: -55℃~+155℃; ComponentLink1Description: Datasheet; ComponentLink1URL: https://wmsc.lcsc.com/wmsc/upload/file/pdf/v2/lcsc/2403141437_KOA-Speer-Elec-RK73B2ETTD332J_C830183.pdf; ComponentLink2Description: JLCPCB Part URL; ComponentLink2URL: https://jlcpcb.com/partdetail/C830183
pins: 1, 2
1 alternate drawing of the same symbol

## RK73B2ETTD392J
designator R?  Resistance: 3.9kΩ  (hidden comment: *)
Resistor, 3.9kΩ, ±5%, 500mW, ±200ppm/℃, -55℃~+155℃, SMD 1210; Manufacturer: Uniroyal; Manufacturer Part Number: RK73B2ETTD392J; Supplier 1: LCSC; Supplier Part Number 1: C830184; JLCPCB Part Number: C830184; Power Rating: 500mW; Category: Resistors; Package Size: 1210; JLCPCB Basic Part: Yes; Tolerance: ±5%; Temperature Coefficient: ±200ppm/℃; Temperature Rating: -55℃~+155℃; ComponentLink1Description: Datasheet; ComponentLink1URL: https://wmsc.lcsc.com/wmsc/upload/file/pdf/v2/lcsc/2403141437_KOA-Speer-Elec-RK73B2ETTD392J_C830184.pdf; ComponentLink2Description: JLCPCB Part URL; ComponentLink2URL: https://jlcpcb.com/partdetail/C830184
pins: 1, 2
1 alternate drawing of the same symbol
